# Altium footprint library USB2XXX.PcbLib: 21 footprints (part 1 of 2)
Each footprint in its own frame and in the unit in brackets; x right, y up, seen from the top. Pads: shape width x height; smd on the part's side, far side on the other; paste and mask are expansions set on the pad; w line width, h text height; cw(c..) or ccw(c..) is an arc to the next point about the centre after c.
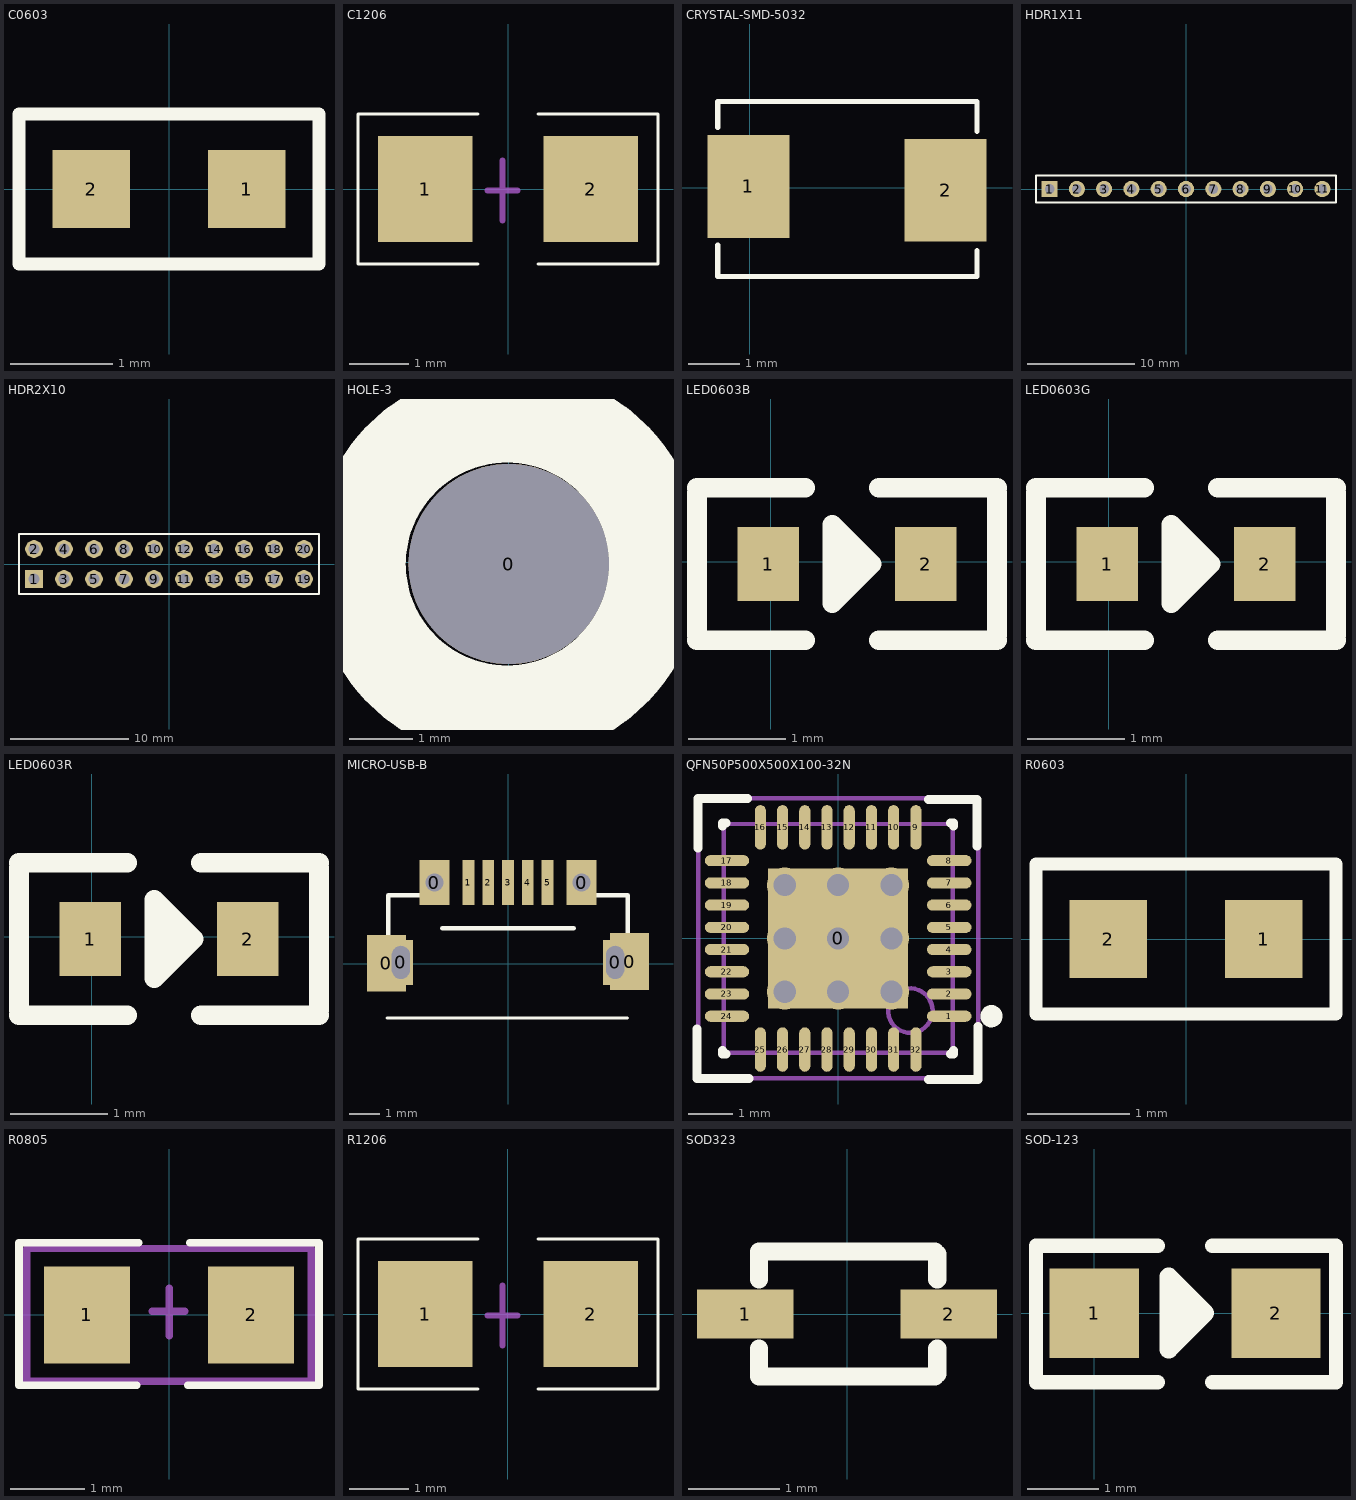
[diagram p0: the footprints below, top view; thin cyan lines are the x and y axes]

## C0603 [mil]
height 35.04
pads (2):
  rect 30x30 smd: 1(30,0) 2(-30,0)
Top Overlay:
  lines w5: -58,-29 -58,29 58,29 58,-29 -58,-29
3D body: height 35.28, standoff -0.15, extent -31.99,-15.94 31,15.94

## C1206 [mm]
height 1
pads (2):
  rect 1.6x1.8 smd: 1(-1.4,0) 2(1.4,0)
Top Overlay:
  lines w0.051: -0.508,-1.27 -2.54,-1.27 -2.54,1.27 -0.508,1.27 ; 0.508,-1.27 2.54,-1.27 2.54,1.27 0.508,1.27
Mechanical 15:
  lines w0.1: -0.349,-0.025 0.159,-0.025 ; -0.095,-0.533 -0.095,0.483
3D body: height 1.02, standoff 0.01, extent -1.575,-0.813 1.625,0.797

## CRYSTAL-SMD-5032 [mm]
pads (2):
  rect 1.6x2 smd: 1(-0.025,0.025) 2(3.81,-0.051)
Top Overlay:
  lines w0.1: -0.622,-1.118 -0.622,-1.727 4.42,-1.727 4.42,-1.219 ; -0.622,1.168 -0.622,1.676 4.42,1.676 4.42,1.092
3D body: height 1.35, standoff 0, extent -0.62,-1.625 4.38,1.575

## HDR1X11 [mm] "Connector; Header; 11 Position"
pads (11):
  rect 1.5x1.5 hole 0.9: 1(-12.7,0)
  round 1.5 hole 0.9: 2(-10.16,0) 3(-7.62,0) 4(-5.08,0) 5(-2.54,0) 6(0,0) 7(2.54,0) 8(5.08,0) 9(7.62,0) 10(10.16,0) 11(12.7,0)
Top Overlay:
  lines w0.2: -13.97,-1.27 13.97,-1.27 13.97,1.27 -12.065,1.27 -13.97,1.27 -13.97,-1.27
3D body: height 8.6, standoff -2.94, extent -13.995,-1.219 13.945,1.321

## HDR2X10 [mm] "Connector; Header; 10x2 Position"
pads (20):
  rect 1.5x1.5 hole 0.9: 1(-11.43,-1.27)
  round 1.5 hole 0.9: 2(-11.43,1.27) 3(-8.89,-1.27) 4(-8.89,1.27) 5(-6.35,-1.27) 6(-6.35,1.27) 7(-3.81,-1.27) 8(-3.81,1.27) 9(-1.27,-1.27) 10(-1.27,1.27) 11(1.27,-1.27) 12(1.27,1.27) 13(3.81,-1.27) 14(3.81,1.27) 15(6.35,-1.27) 16(6.35,1.27) 17(8.89,-1.27) 18(8.89,1.27) 19(11.43,-1.27) 20(11.43,1.27)
Top Overlay:
  lines w0.2: -12.7,-2.54 -12.7,2.54 -10.795,2.54 12.7,2.54 12.7,-2.54 -10.795,-2.54 -12.7,-2.54
3D body: height 8.57, standoff -2.97, extent -12.7,-2.54 12.7,2.54

## HOLE-3 [mil]
pads (1):
  round 124 hole 124: 0(0,-1)
Top Overlay:
  circle w59.06: c-1,-1 r92.31
Bottom Overlay:
  circle w59.06: c0,-1 r92.31

## LED0603B [mil]
pads (2):
  rect 25x30 smd: 1(-1,-1) 2(63,-1)
Top Overlay:
  lines w7.87: 30,6 30,-6 35,-1 41,-1 ; 41,-1 25,15 25,-17 41,-1
  lines w8: -30,-32 14,-32 ; -30,-30 -30,28 ; -30,30 14,30 ; 44,-32 92,-32 ; 44,30 92,30 ; 92,-30 92,28
3D body: height 35.43, standoff 0, extent -1.5,-18.71 65.43,16.72

## LED0603G [mil]
pads (2):
  rect 25x30 smd: 1(-0.5,-1) 2(63.5,-1)
Top Overlay:
  lines w7.87: 30.5,6 30.5,-6 35.5,-1 41.5,-1 ; 41.5,-1 25.5,15 25.5,-17 41.5,-1
  lines w8: -29.5,-32 14.5,-32 ; -29.5,-30 -29.5,28 ; -29.5,30 14.5,30 ; 44.5,-32 92.5,-32 ; 44.5,30 92.5,30 ; 92.5,-30 92.5,28
3D body: height 35.43, standoff 0, extent -2.47,-18.71 64.46,16.72

## LED0603R [mil]
pads (2):
  rect 25x30 smd: 1(-0.5,-1.01) 2(63.5,-1.01)
Top Overlay:
  lines w7.87: 30.5,5.99 30.5,-6.01 35.5,-1.01 41.5,-1.01 ; 41.5,-1.01 25.5,-17.01 25.5,14.99 41.5,-1.01
  lines w8: -29.5,-32.01 14.5,-32.01 ; -29.5,-30.01 -29.5,27.99 ; -29.5,29.99 14.5,29.99 ; 44.5,-32.01 92.5,-32.01 ; 44.5,29.99 92.5,29.99 ; 92.5,-30.01 92.5,27.99
3D body: height 35.43, standoff 0, extent -1.47,-18.71 65.46,16.72

## MICRO-USB-B [mm]
pads (11):
  rect 1.3x1.9 smd: 0(-4.064,0.025) 0(4.064,0.076)
  rect 0.8x1.5 hole 0.6 slot 1.1 at 90 deg: 0(-3.581,0.051) 0(3.581,0.051)
  rect 1x1.5 hole 0.6: 0(-2.464,2.718) 0(2.464,2.718)
  rect 0.4x1.5 smd: 1(-1.321,2.718) 2(-0.66,2.718) 3(0,2.718) 4(0.66,2.718) 5(1.321,2.718)
Top Overlay:
  lines w0.1: -4.05,-1.8 4,-1.8
  lines w0.152: -4,0.584 -4,2.3 -2.65,2.3 ; -2.2,1.2 2.2,1.2 ; 2.65,2.3 4,2.3 4,0.55
3D body: height 2.66, standoff -0.64, extent -4.1,-2.551 4.1,2.879

## QFN50P500X500X100-32N [mm]
pads (33):
  rect 3.15x3.15 smd: 0(0,0)
  oval 1x0.25 smd: 1(2.5,-1.75) 2(2.5,-1.25) 3(2.5,-0.75) 4(2.5,-0.25) 5(2.5,0.25) 6(2.5,0.75) 7(2.5,1.25) 8(2.5,1.75) 17(-2.5,1.75) 18(-2.5,1.25) 19(-2.5,0.75) 20(-2.5,0.25) 21(-2.5,-0.25) 22(-2.5,-0.75) 23(-2.5,-1.25) 24(-2.5,-1.75)
  oval 0.25x1 smd: 9(1.75,2.5) 10(1.25,2.5) 11(0.75,2.5) 12(0.25,2.5) 13(-0.25,2.5) 14(-0.75,2.5) 15(-1.25,2.5) 16(-1.75,2.5) 25(-1.75,-2.5) 26(-1.25,-2.5) 27(-0.75,-2.5) 28(-0.25,-2.5) 29(0.25,-2.5) 30(0.75,-2.5) 31(1.25,-2.5) 32(1.75,-2.5)
via 1.2,1.2 diameter 0.8 hole 0.5
via 1.2,0 diameter 0.8 hole 0.5
via 0,1.2 diameter 0.8 hole 0.5
via -1.2,1.2 diameter 0.8 hole 0.5
via -1.2,0 diameter 0.8 hole 0.5
via 0,0 diameter 0.8 hole 0.5
via -1.2,-1.2 diameter 0.8 hole 0.5
via 0,-1.2 diameter 0.8 hole 0.5
via 1.2,-1.2 diameter 0.8 hole 0.5
Top Overlay:
  circle w0.25: c3.45,-1.75 r0.125
  lines w0.2: -3.175,-2.032 -3.175,-3.15 -2.007,-3.15 ; -3.15,2.032 -3.15,3.15 -2.032,3.15 ; -2.6,-2.525 -2.6,-2.6 -2.525,-2.6 ; -2.6,2.525 -2.6,2.6 -2.525,2.6 ; 2.032,-3.175 3.15,-3.175 3.15,-1.981 ; 2.032,3.124 3.124,3.124 3.124,2.083 ; 2.525,-2.6 2.6,-2.6 2.6,-2.525 ; 2.525,2.6 2.6,2.6 2.6,2.525
Mechanical 13:
  circle w0.1: c1.625,-1.625 r0.5
  lines w0.1: -2.575,-2.575 2.575,-2.575 2.575,2.575 -2.575,2.575 -2.575,-2.575
Mechanical 15:
  lines w0.1: -0.5,0 0.5,0 ; 0,-0.5 0,0.5 ; -3.15,-3.15 3.15,-3.15 3.15,3.15 -3.15,3.15 -3.15,-3.15
3D body: height 0.8, standoff 0, extent -2.501,-2.51 2.519,2.51

## R0603 [mil]
height 35.04
pads (2):
  rect 30x30 smd: 1(30,0) 2(-30,0)
Top Overlay:
  lines w5: -58,-29 58,-29 58,29 -58,29 -58,-29
3D body: height 35.93, standoff 0.5, extent -31.99,-16 31,15.89

## R0805 [mm]
height 0.5
pads (2):
  rect 1.15x1.3 smd: 1(-1.1,0) 2(1.1,0)
Top Overlay:
  lines w0.102: -0.432,-0.94 -2.007,-0.94 -2.007,0.965 -0.406,0.965 ; 0.254,-0.94 2.007,-0.94 2.007,0.965 0.279,0.965
Mechanical 15:
  lines w0.1: -0.222,0.051 0.006,0.051 ; 0.006,-0.279 0.006,0.356 ; 0.006,0.025 0.006,0.051 ; 0.21,0.051 0.006,0.051 ; -1.905,-0.889 1.905,-0.889 1.905,0.889 -1.905,0.889 -1.905,-0.889
3D body: height 0.5, standoff -0.01, extent -1,-0.61 1,0.6

## R1206 [mm]
height 1
pads (2):
  rect 1.6x1.8 smd: 1(-1.4,0) 2(1.4,0)
Top Overlay:
  lines w0.051: -0.508,-1.27 -2.54,-1.27 -2.54,1.27 -0.508,1.27 ; 0.508,-1.27 2.54,-1.27 2.54,1.27 0.508,1.27
Mechanical 15:
  lines w0.1: -0.349,-0.025 0.159,-0.025 ; -0.095,-0.533 -0.095,0.483
3D body: height 1, standoff -0.01, extent -1.6,-0.813 1.6,0.797

## SOD323 [mm]
pads (2):
  rect 1.06x0.54 smd: 1(-1.118,0) 2(1.118,0)
Top Overlay:
  lines w0.2: -0.965,-0.381 -0.965,-0.686 0.965,-0.686 ; -0.965,0.381 -0.965,0.686 0.965,0.686 ; 0.991,-0.66 0.991,-0.381 ; 0.991,0.381 0.991,0.66
3D body: height 1.1, standoff 0, extent -1.35,-0.615 1.35,0.635

## SOD-123 [mm]
pads (2):
  rect 1.25x1.25 smd: 1(0,0) 2(2.54,0)
Top Overlay:
  lines w0.2: 0.889,-0.965 -0.813,-0.965 -0.813,0.94 0.889,0.94 ; 1.651,-0.965 3.378,-0.965 3.378,0.94 1.651,0.94
  lines w0.254: 1.041,-0.254 1.168,-0.254 1.295,-0.127 1.295,0 1.195,0.1 1.041,0.254 1.041,0.508 ; 1.041,0.508 1.041,-0.508 1.549,0 1.041,0.508
3D body: height 1.42, standoff -0.03, extent -0.655,-0.864 3.195,0.836